# Altium footprint library Sparks.PcbLib: 30 footprints (part 1 of 2)
Each footprint in its own frame and in the unit in brackets; x right, y up, seen from the top. Pads: shape width x height; smd on the part's side, far side on the other; paste and mask are expansions set on the pad; w line width, h text height; cw(c..) or ccw(c..) is an arc to the next point about the centre after c.
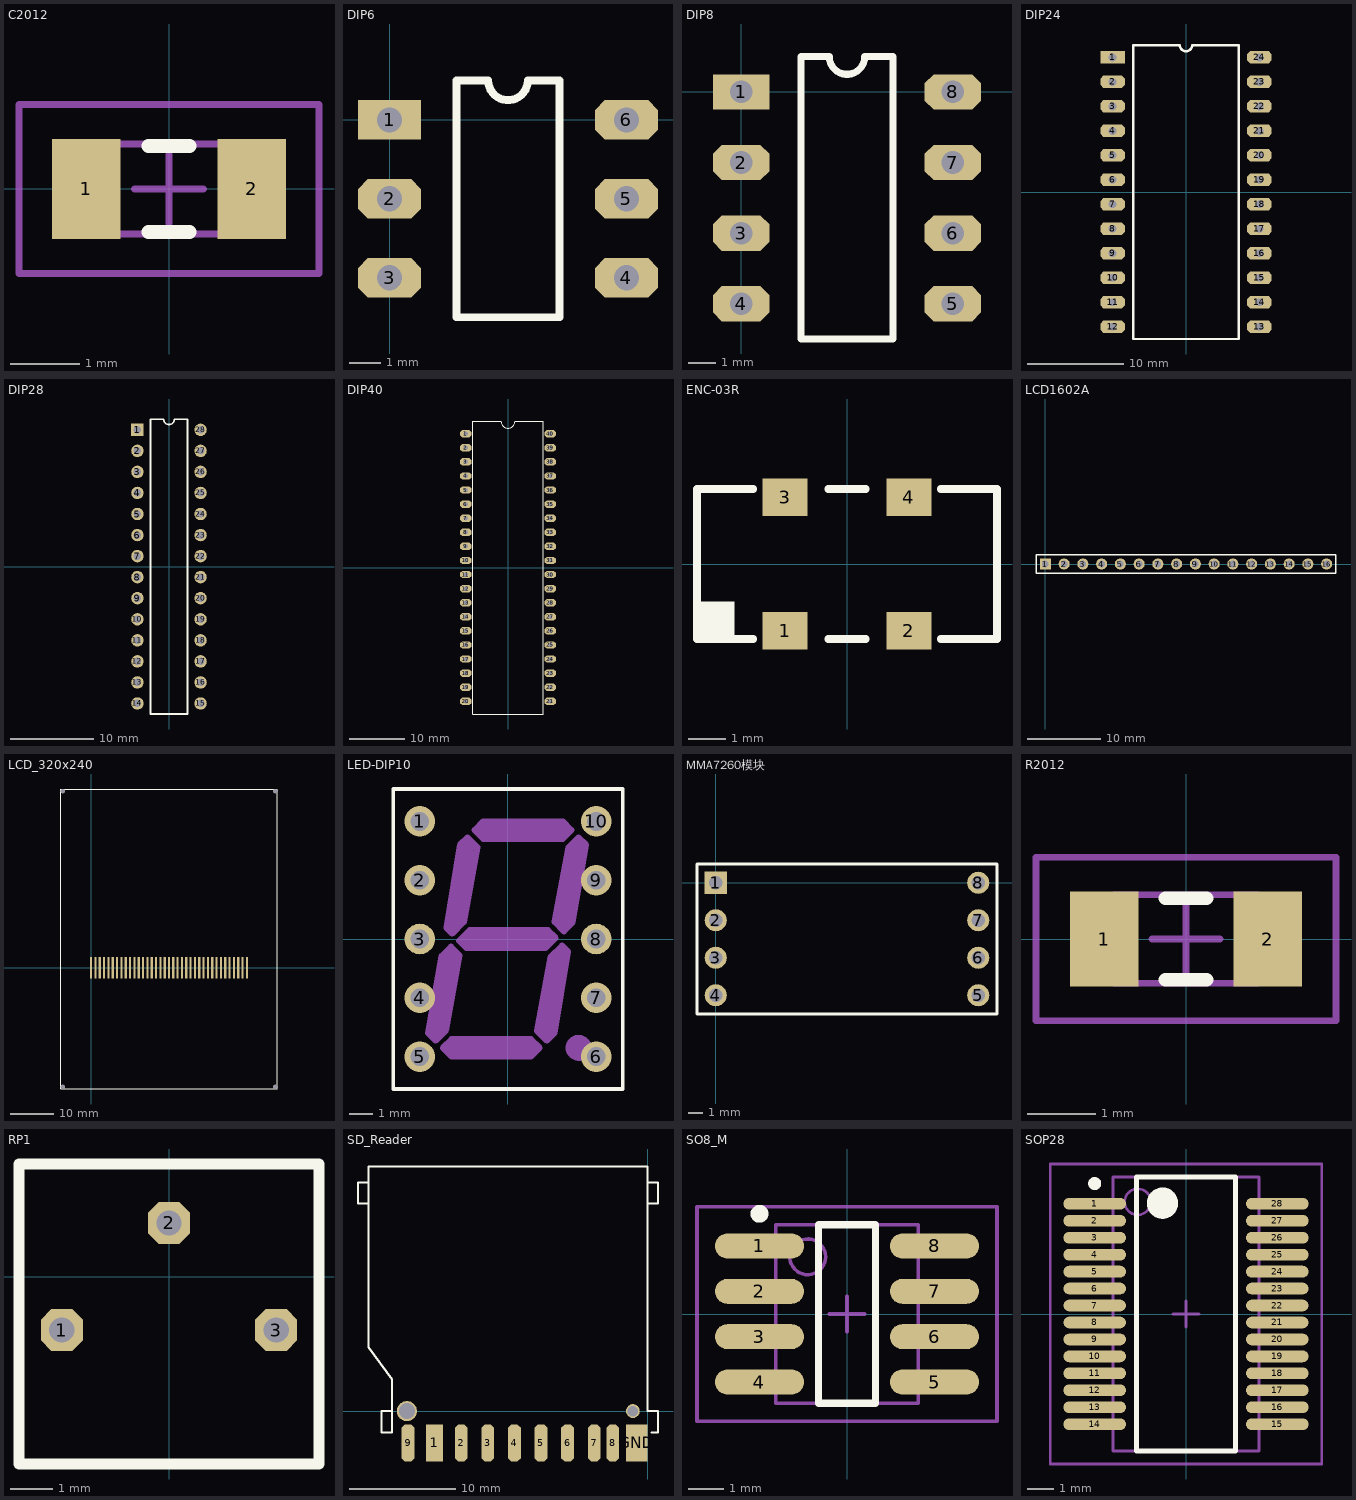
[diagram p0: the footprints below, top view; thin cyan lines are the x and y axes]

## C2012 [mm] "Chip Capacitor, 2-Leads, Body 2.0x1.2mm, IPC Low Density"
height 0.6
pads (2):
  rect 1x1.45 smd: 1(-1.2,0) 2(1.2,0)
Top Overlay:
  lines w0.2: -0.3,-0.625 0.3,-0.625 ; -0.3,0.625 0.3,0.625
Mechanical 13:
  lines w0.1: -1.05,-0.65 1.05,-0.65 1.05,0.65 -1.05,0.65 -1.05,-0.65
Mechanical 15:
  lines w0.1: -0.5,0 0.5,0 ; 0,-0.5 0,0.5 ; -2.175,-1.225 2.175,-1.225 2.175,1.225 -2.175,1.225 -2.175,-1.225
3D body: height 0.5, standoff 0, extent -0.984,-0.6 1.016,0.6

## DIP6 [mil]
pads (6):
  rect 80x50 hole 32: 1(0,0)
  oct 80x50 hole 32: 2(0,-100) 3(0,-200) 4(300,-200) 5(300,-100) 6(300,0)
Top Overlay:
  lines w10: 85,-250 215,-250 215,50 175,50 cw(c150,50) 125,50 85,50 85,-250
3D body: height 210, standoff -95, extent -5,-250 305,50

## DIP8 [mil]
pads (8):
  rect 80x50 hole 32: 1(0,0)
  oct 80x50 hole 32: 2(0,-100) 3(0,-200) 4(0,-300) 5(300,-300) 6(300,-200) 7(300,-100) 8(300,0)
Top Overlay:
  lines w10: 85,-350 215,-350 215,50 175,50 cw(c150,50) 125,50 85,50 85,-350
3D body: height 210, standoff -95, extent -5,-350 305,50

## DIP24 [mil]
pads (24):
  rect 100x50 hole 32: 1(-300,550)
  oct 100x50 hole 32: 2(-300,450) 3(-300,350) 4(-300,250) 5(-300,150) 6(-300,50) 7(-300,-50) 8(-300,-150) 9(-300,-250) 10(-300,-350) 11(-300,-450) 12(-300,-550) 13(300,-550) 14(300,-450) 15(300,-350) 16(300,-250) 17(300,-150) 18(300,-50) 19(300,50) 20(300,150) 21(300,250) 22(300,350) 23(300,450) 24(300,550)
Top Overlay:
  lines w10: -215,-600 -215,600 -25,600 ccw(c0,600) 25,600 215,600 215,-600 -215,-600
3D body: height 210, standoff -95, extent -305,-600 305,600

## DIP28 [mm] "DIP; 28 Leads; Row Spacing 7.62 mm; Pitch 2.54 mm"
height 4.58
pads (28):
  rect 1.5x1.5 hole 0.9: 1(-3.81,16.51)
  round 1.5 hole 0.9: 2(-3.81,13.97) 3(-3.81,11.43) 4(-3.81,8.89) 5(-3.81,6.35) 6(-3.81,3.81) 7(-3.81,1.27) 8(-3.81,-1.27) 9(-3.81,-3.81) 10(-3.81,-6.35) 11(-3.81,-8.89) 12(-3.81,-11.43) 13(-3.81,-13.97) 14(-3.81,-16.51) 15(3.81,-16.51) 16(3.81,-13.97) 17(3.81,-11.43) 18(3.81,-8.89) 19(3.81,-6.35) 20(3.81,-3.81) 21(3.81,-1.27) 22(3.81,1.27) 23(3.81,3.81) 24(3.81,6.35) 25(3.81,8.89) 26(3.81,11.43) 27(3.81,13.97) 28(3.81,16.51)
Top Overlay:
  lines w0.2: -2.225,-17.78 -2.225,17.78 -0.635,17.78 ccw(c0,17.78) 0.635,17.78 2.225,17.78 2.225,-17.78 -2.225,-17.78
3D body: height 5.33, standoff -2.41, extent -3.81,-17.78 4.064,17.78

## DIP40 [mil]
pads (40):
  oct 80x52 hole 32: 1(-300,950) 2(-300,850) 3(-300,750) 4(-300,650) 5(-300,550) 6(-300,450) 7(-300,350) 8(-300,250) 9(-300,150) 10(-300,50) 11(-300,-50) 12(-300,-150) 13(-300,-250) 14(-300,-350) 15(-300,-450) 16(-300,-550) 17(-300,-650) 18(-300,-750) 19(-300,-850) 20(-300,-950) 21(300,-950) 22(300,-850) 23(300,-750) 24(300,-650) 25(300,-550) 26(300,-450) 27(300,-350) 28(300,-250) 29(300,-150) 30(300,-50) 31(300,50) 32(300,150) 33(300,250) 34(300,350) 35(300,450) 36(300,550) 37(300,650) 38(300,750) 39(300,850) 40(300,950)
Top Overlay:
  lines w6: -250,-1040 -250,1040 -50,1040 ccw(c0,1040) 50,1040 250,1040 250,-1040 -250,-1040
3D body: height 210, standoff -95, extent -305,-1000 305,1000

## ENC-03R [mm]
pads (4):
  rect 1.2x1 smd: 1(-1.65,-1.775) 2(1.65,-1.775) 3(-1.65,1.775) 4(1.65,1.775)
Top Overlay:
  rectangle: -4,-2 -3,-1
  lines w0.203: -2.5,-2 -4,-2 -4,2 -2.5,2 ; -0.5,-2 0.5,-2 ; -0.5,2 0.5,2 ; 2.5,-2 4,-2 4,2 2.5,2
3D body: height 2, standoff 0, extent -4,-2 4,2

## LCD1602A [mm] "LCD1602A液晶显示器"
pads (16):
  rect 1.5x1.5 hole 0.9: 1(0,0)
  round 1.5 hole 0.9: 2(2.54,0) 3(5.08,0) 4(7.62,0) 5(10.16,0) 6(12.7,0) 7(15.24,0) 8(17.78,0) 9(20.32,0) 10(22.86,0) 11(25.4,0) 12(27.94,0) 13(30.48,0) 14(33.02,0) 15(35.56,0) 16(38.1,0)
Top Overlay:
  lines w0.2: -1.27,-1.27 39.37,-1.27 39.37,1.27 0.635,1.27 -1.27,1.27 -1.27,-1.27
3D body: height 21.34, standoff -2.98, extent -8,-34.5 72.5,2

## LCD_320x240 [mm]
pads (41):
  rect 0.5x5 smd: 1(0,0) 2(1,0) 3(2,0) 4(3,0) 5(4,0) 6(5,0) 7(6,0) 8(7,0) 9(8,0) 10(9,0) 11(10,0) 12(11,0) 13(12,0) 14(13,0) 15(14,0) 16(15,0) 17(16,0) 18(17,0) 19(18,0) 20(19,0) 21(20,0) 22(21,0) 23(22,0) 24(23,0) 25(24,0) 26(25,0) 27(26,0) 28(27,0) 29(28,0) 30(29,0) 31(30,0) 32(31,0) 33(32,0) 34(33,0) 35(34,0) 36(35,0) 37(36,0)
  round 0.95 hole 1: ""(-6.52,-27.52) ""(-6.52,40.72) ""(42.52,-27.52) ""(42.52,40.72)
Top Overlay:
  lines w0.254: -7,-28 -7,41.2 43,41.2 43,-28 -7,-28
3D body: height 4.2, standoff -0.8, extent -7,-28 43,41.2

## LED-DIP10 [mil]
pads (10):
  round 52 hole 32: 1(-150,200) 2(-150,100) 3(-150,0) 4(-150,-100) 5(-150,-200) 6(150,-200) 7(150,-100) 8(150,0) 9(150,100) 10(150,200)
Top Overlay:
  lines w6: -195,-255 -195,255 195,255 195,-255 -195,-255
Mechanical 1:
  circle w24: c120,-185 r10
  lines w10: -136,-160 -123,-173 -105,-155 -82,-28 -97,-13 -113,-29 -136,-160 ; -111,-185 -96,-200 39,-200 54,-185 39,-170 -96,-170 -111,-185 ; -105,19 -82,160 -69,173 -52,156 -75,29 -95,9 -105,19 ; -83,-3 -71,-15 64,-15 81,2 68,15 -65,15 -83,-3 ; -57,185 -42,200 93,200 108,185 93,170 -42,170 -57,185 ; 49,-156 66,-173 79,-160 102,-21 92,-11 72,-31 49,-156 ; 79,29 95,13 110,28 133,160 120,173 103,156 79,29
  lines w12: 115,-185 125,-185
  lines w24: -120,-155 -95,-25 ; -95,-185 40,-185 ; -90,25 -70,155 ; -70,0 65,0 ; -40,185 95,185 ; 65,-155 90,-25 ; 95,30 120,160
3D body: height 279.53, standoff -255.91, extent -196.85,-255.91 196.85,255.91

## MMA7260模块 [mm]
pads (8):
  rect 1.5x1.5 hole 0.9: 1(0,0)
  round 1.5 hole 0.9: 2(0,-2.54) 3(0,-5.08) 4(0,-7.62) 5(17.78,-7.62) 6(17.78,-5.08) 7(17.78,-2.54) 8(17.78,0)
Top Overlay:
  lines w0.203: -1.27,-8.89 19.05,-8.89 19.05,1.27 -1.27,1.27 -1.27,-8.89
3D body: height 5.46, standoff -5.06, extent -3.81,-10.16 21.59,2.54

## R2012 [mm] "Chip Resistor, 2-Leads, Body 2.0x1.2mm, IPC Low Density"
height 0.6
pads (2):
  rect 1x1.4 smd: 1(-1.2,0) 2(1.2,0)
Top Overlay:
  lines w0.2: -0.3,-0.6 0.3,-0.6 ; -0.3,0.6 0.3,0.6
Mechanical 13:
  lines w0.1: -1.05,-0.65 1.05,-0.65 1.05,0.65 -1.05,0.65 -1.05,-0.65
Mechanical 15:
  lines w0.1: -0.5,0 0.5,0 ; 0,-0.5 0,0.5 ; -2.2,-1.2 2.2,-1.2 2.2,1.2 -2.2,1.2 -2.2,-1.2
3D body: height 0.5, standoff 0, extent -0.984,-0.6 1.016,0.6

## RP1 [mm]
pads (3):
  oct 1x1 hole 0.6: 1(-2.54,-1.27) 2(0,1.27) 3(2.54,-1.27)
Top Overlay:
  lines w0.254: -3.556,-4.445 3.556,-4.445 3.556,2.667 -3.556,2.667 -3.556,-4.445
3D body: height 6.35, standoff -5.08, extent -3.556,-4.445 3.556,2.667

## SD_Reader [mm]
height 0.254
pads (12):
  rect 1.6x3.5 smd: 1(-20.036,-3)
  oct 1.2x3.5 smd: 2(-17.536,-3) 3(-15.036,-3) 4(-12.536,-3) 5(-10.036,-3) 6(-7.536,-3) 7(-5.036,-3) 8(-3.286,-3) 9(-22.536,-3)
  rect 2x3.5 smd: GND(-1.036,-3)
  round 1.9 hole 1.5: ""(-22.636,0)
  round 1.3 hole 1: ""(-1.4,0)
Top Overlay:
  lines w0.203: -26.236,19.5 -27.236,19.5 -27.236,21.5 -26.236,21.5 ; -24.036,0 -25.036,0 -25.036,-2 -24.036,-2 -24.036,3 -26.236,6 -26.236,23 -0.036,23 -0.036,0.024 ; -0.036,0 0.964,0 0.964,-2 0.364,-2 ; -0.036,19.5 0.964,19.5 0.964,21.5 -0.036,21.5
3D body: height 3.25, standoff -0.25, extent -26.55,-2 0.35,23

## SO8_M [mm] "SOIC, 8-Leads, Body 4.9x3.9mm, Pitch 1.27mm, IPC Low Density"
height 1.75
pads (8):
  oval 2.5x0.7 smd: 1(-2.45,1.905) 2(-2.45,0.635) 3(-2.45,-0.635) 4(-2.45,-1.905) 5(2.45,-1.905) 6(2.45,-0.635) 7(2.45,0.635) 8(2.45,1.905)
Top Overlay:
  circle w0.25: c-2.45,2.805 r0.125
  lines w0.2: -0.8,-2.5 0.8,-2.5 0.8,2.5 -0.8,2.5 -0.8,-2.5
Mechanical 13:
  circle w0.1: c-1.1,1.6 r0.5
  lines w0.1: -2,-2.5 2,-2.5 2,2.5 -2,2.5 -2,-2.5
Mechanical 15:
  lines w0.1: -0.5,0 0.5,0 ; 0,-0.5 0,0.5 ; -4.2,-3 4.2,-3 4.2,3 -4.2,3 -4.2,-3
3D body: height 1.9, standoff 0, extent -3.028,-2.5 3.028,2.5

## SOP28 [mm] "SOP, 28-Leads, Body 10.5x5.6mm (max), Pitch 0.65mm, IPC Low Density"
height 2
pads (28):
  oval 2.4x0.45 smd: 1(-3.5,4.225) 2(-3.5,3.575) 3(-3.5,2.925) 4(-3.5,2.275) 5(-3.5,1.625) 6(-3.5,0.975) 7(-3.5,0.325) 8(-3.5,-0.325) 9(-3.5,-0.975) 10(-3.5,-1.625) 11(-3.5,-2.275) 12(-3.5,-2.925) 13(-3.5,-3.575) 14(-3.5,-4.225) 15(3.5,-4.225) 16(3.5,-3.575) 17(3.5,-2.925) 18(3.5,-2.275) 19(3.5,-1.625) 20(3.5,-0.975) 21(3.5,-0.325) 22(3.5,0.325) 23(3.5,0.975) 24(3.5,1.625) 25(3.5,2.275) 26(3.5,2.925) 27(3.5,3.575) 28(3.5,4.225)
Top Overlay:
  circle w0.25: c-3.5,5 r0.125
  circle w0.6: c-0.9,4.25 r0.3
  lines w0.2: -1.9,-5.25 -1.9,5.25 1.9,5.25 1.9,-5.25 -1.9,-5.25
Mechanical 13:
  circle w0.1: c-1.85,4.3 r0.5
  lines w0.1: -2.8,-5.25 -2.8,5.25 2.8,5.25 2.8,-5.25 -2.8,-5.25
Mechanical 15:
  lines w0.1: -0.5,0 0.5,0 ; 0,-0.5 0,0.5 ; -5.2,-5.75 -5.2,5.75 5.2,5.75 5.2,-5.75 -5.2,-5.75
3D body: height 2, standoff -0.05, extent -3.9,-5.1 3.9,5.1